# Altium footprint library PcbLib.PcbLib: 428 footprints (part 5 of 27)
Each footprint in its own frame and in the unit in brackets; x right, y up, seen from the top. Pads: shape width x height; smd on the part's side, far side on the other; paste and mask are expansions set on the pad; w line width, h text height; cw(c..) or ccw(c..) is an arc to the next point about the centre after c.
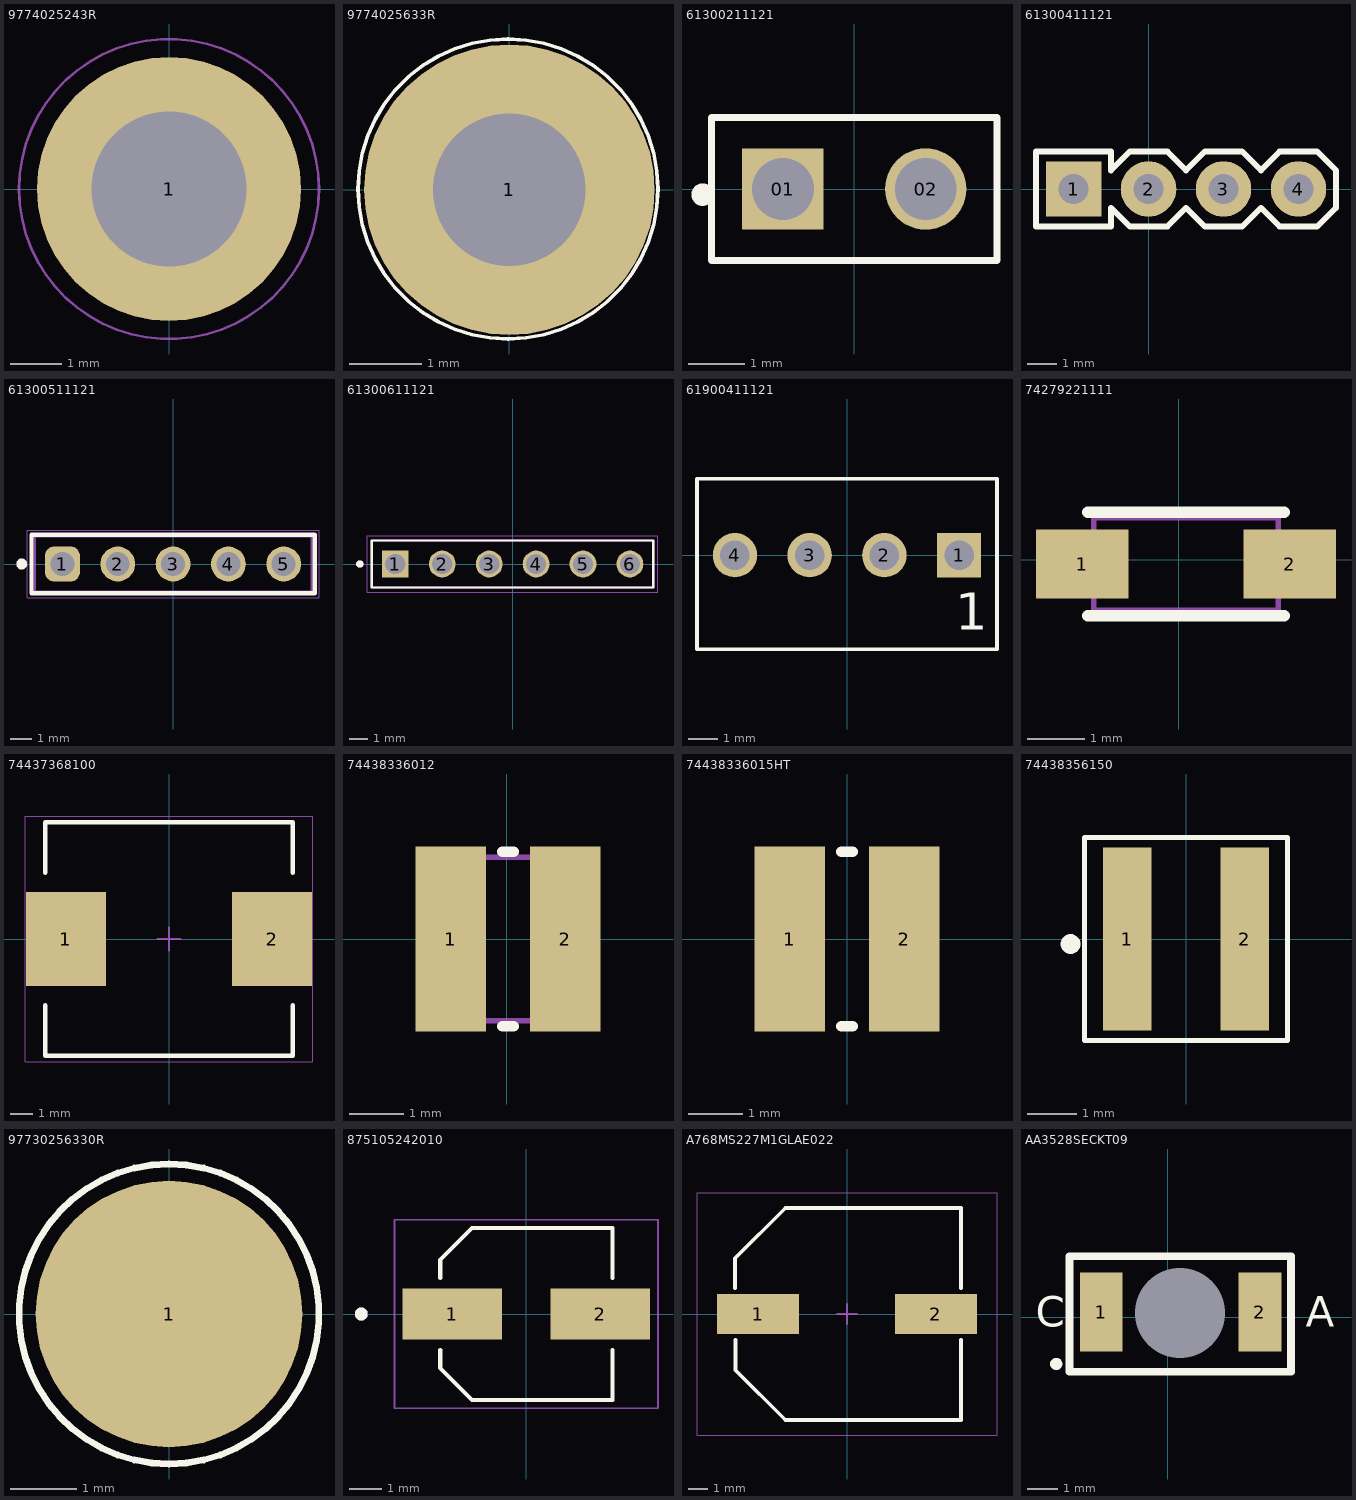
[diagram p4: the footprints below, top view; thin cyan lines are the x and y axes]

## 9774025243R [mm]
pads (2):
  round 5.1 smd paste-4: 1(0,0)
  round 3.1 hole 3 unplated: ""(0,0)
Top Paste:
  drawing of 4 lines, arcs and shapes, not listed
Mechanical 13:
  circle w0.127: c0,0 r2.175
Mechanical 15:
  circle w0.05: c0,0 r2.9
3D body "Download_STP_9774025243R_rev1.stp": height 2.6, standoff -1.3, extent -2.175,-2.163 2.175,2.163

## 9774025633R [mm]
pads (1):
  round 4 hole 2.1 mask+0.102: 1(0,0)
Top Overlay:
  circle w0.05: c-0.02,0.01 r2.065
Top Paste:
  drawing of 4 lines, arcs and shapes, not listed
3D body "Download_STEP_9774025633_rev1.stp": height 2.6, standoff -0.6, extent -1.67,-1.628 1.63,1.648

## 61300211121 [mm]
pads (2):
  rect 1.45x1.45 / inner round 1.45 / far side rect 1.45x1.45 hole 1.1: 01(-1.27,0)
  round 1.45 hole 1.1: 02(1.27,0)
Top Overlay:
  circle w0.2: c-2.7,-0.1 r0.1
  lines w0.127: -2.54,-1.27 2.54,-1.27 2.54,1.27 -2.54,1.27 -2.54,-1.27

## 61300411121 [mil]
pads (4):
  rect 74x74 / inner round 74 / far side rect 74x74 hole 40: 1(-100,0)
  round 74 hole 40: 2(0,0) 3(100,0) 4(200,0)
Top Overlay:
  lines w8: -150,-50 -50,-50 -50,-25 -25,-50 25,-50 50,-25 75,-50 125,-50 150,-25 175,-50 225,-50 250,-25 250,25 225,50 175,50 150,25 125,50 75,50 50,25 25,50 -25,50 -50,25 -50,50 -150,50 -150,-50
Mechanical 13:
  region: -90,-10 -110,-10 -110,10 -90,10
  region: 10,-10 -10,-10 -10,10 10,10
  region: 110,-10 90,-10 90,10 110,10
  region: 210,-10 190,-10 190,10 210,10

## 61300511121 [mm] "Pin Header, pitch 2.54 mm, THT, Vertical, single row, 5p"
height 8.54
pads (5):
  rrect50% 1.6x1.6 hole 1.1: 1(-5.08,0)
  round 1.6 hole 1.1: 2(-2.54,0) 3(0,0) 4(2.54,0) 5(5.08,0)
Top Overlay:
  circle w0.25: c-6.95,0 r0.125
  lines w0.2: -6.5,-1.345 -6.5,1.345 6.5,1.345 6.5,-1.345 -6.5,-1.345
Top Courtyard:
  lines w0.05: -6.7,-1.545 6.7,-1.545 6.7,1.545 -6.7,1.545 -6.7,-1.545
Top Component Outline:
  lines w0.1: -6.35,-1.27 6.35,-1.27 6.35,1.27 -6.35,1.27 -6.35,-1.27
Top Component Center:
  lines w0.05: -0.5,0 0.5,0 ; 0,-0.5 0,0.5
3D body "61300511121.stp": height 8.57, standoff -2.97, extent -6.35,-1.27 6.35,1.27

## 61300611121 [mm]
pads (6):
  rect 1.45x1.45 / inner round 1.45 / far side rect 1.45x1.45 hole 1.1: 1(-6.35,0)
  round 1.45 hole 1.1: 2(-3.81,0) 3(-1.27,0) 4(1.27,0) 5(3.81,0) 6(6.35,0)
Top Overlay:
  circle w0.2: c-8.27,0 r0.1
  lines w0.127: -7.62,-1.27 -7.62,1.27 7.62,1.27 7.62,-1.27 -7.62,-1.27
Mechanical 13:
  circle w0.2: c-8.27,0 r0.1
  lines w0.127: -7.62,-1.27 -7.62,1.27 7.62,1.27 7.62,-1.27 -7.62,-1.27
Mechanical 15:
  lines w0.05: -7.87,-1.52 -7.87,1.52 7.87,1.52 7.87,-1.52 -7.87,-1.52

## 61900411121 [mm]
pads (4):
  rect 1.508x1.508 hole 1: 1(3.81,0)
  round 1.508 hole 1: 2(1.27,0) 3(-1.27,0) 4(-3.81,0)
Top Overlay:
  lines w0.127: -5.1,-3.2 -5.1,2.6 5.1,2.6 5.1,-3.2 -5.1,-3.2
  text "1" at 3.683,-2.54 h1.27
3D body "61900411121.stp": height 11.75, standoff -3.15, extent -5.08,-3.26 5.08,2.54

## 74279221111 [mm]
pads (2):
  rect 1.6x1.2 smd: 1(-1.673,-0.076) 2(1.927,-0.076)
Top Overlay:
  lines w0.2: -1.573,-0.976 1.827,-0.976 ; -1.573,0.824 1.827,0.824
Mechanical 13:
  lines w0.1: -1.473,-0.876 -1.473,0.724 1.727,0.724 1.727,-0.876 -1.473,-0.876
3D body "WE-MPSB_1206_MPSB+%28rev1%29.stp": height 1.1, standoff 0, extent -1.498,-0.876 1.702,0.724

## 74437368100 [mm] "Precision Wire Wound Inductor, 2-Leads, Body 10.80x10.16mm, IPC Medium Density"
height 4
pads (2):
  rect 3.5x4.1 smd: 1(-4.5,0) 2(4.5,0)
Top Overlay:
  lines w0.2: -5.4,-2.9 -5.4,-5.1 5.4,-5.1 5.4,-2.9 ; -5.4,2.9 -5.4,5.1 5.4,5.1 5.4,2.9
Mechanical 15:
  lines w0.05: -6.275,-5.35 6.275,-5.35 6.275,5.35 -6.275,5.35 -6.275,-5.35
  lines w0.1: -0.5,0 0.5,0 ; 0,-0.5 0,0.5
3D body "74437368010_Download_STP_WE-LHMI-1040_rev1.stp": height 3.8, standoff 0, extent -5.5,-5 5.5,5

## 74438336012 [mm]
pads (2):
  rect 1.3x3.4 smd paste+0 mask+0.102: 1(-1.025,0) 2(1.075,0)
Top Overlay:
  lines w0.2: -0.075,-1.6 0.125,-1.6 ; -0.075,1.6 0.125,1.6
Mechanical 13:
  lines w0.1: -1.475,-1.5 1.525,-1.5 1.525,1.5 -1.475,1.5 -1.475,-1.5
3D body "WE-MAPI_3020+%28rev1%29.stp": height 2, standoff 0, extent -1.5,-1.5 1.5,1.5

## 74438336015HT [mm]
pads (2):
  rect 1.3x3.4 smd: 1(-1.05,0) 2(1.05,0)
Top Overlay:
  lines w0.2: -0.1,-1.6 0.1,-1.6 ; -0.1,1.6 0.1,1.6
3D body "step_temp.STEP": height 2.1, standoff 0.1, extent -1.5,-1.5 1.5,1.5

## 74438356150 [mm]
pads (2):
  rect 0.98x3.7 smd: 1(-1.185,0) 2(1.185,0)
Top Overlay:
  circle w0.2: c-2.335,-0.102 r0.1
  lines w0.1: -2.05,-2.05 -2.05,2.05 2.05,2.05 2.05,-2.05 -2.05,-2.05
3D body "74438356150.stp": height 2.2, standoff 0, extent -2.05,-2.025 2.05,2.075

## 97730256330R [mm]
pads (1):
  round 4 smd: 1(0,0)
Top Overlay:
  lines w0.1: 0,-2.25 ccw(c0,0) 0,2.25 ccw(c0,0) 0,-2.25
3D body "97730256330R.stp": height 2.5, standoff 0, extent -1.65,-1.636 1.65,1.64

## 875105242010 [mm]
pads (2):
  rect 3.06x1.58 smd: 1(-2.275,0) 2(2.275,0)
Top Overlay:
  circle w0.2: c-5.08,0 r0.1
  lines w0.127: -2.65,-1.11 -2.65,-1.668 -1.668,-2.65 2.65,-2.65 2.65,-1.11 ; -2.65,1.11 -2.65,1.668 -1.668,2.65 2.65,2.65 2.65,1.11
Mechanical 13:
  circle w0.2: c-5.08,0 r0.1
Mechanical 15:
  lines w0.05: -4.055,-2.9 -4.055,2.9 4.055,2.9 4.055,-2.9 -4.055,-2.9
3D body "Download_STP_875105x4200x_rev1.stp": height 5.55, standoff 0.05, extent -3,-2.65 3,2.65

## A768MS227M1GLAE022 [mm] "Aluminum Electrolytic Capacitor, Body 10.80x10.30x10.40mm, IPC Low Density"
height 10.4
pads (2):
  rect 4.15x2.05 smd: 1(-4.5,0) 2(4.5,0)
Top Overlay:
  lines w0.2: -5.664,1.325 -5.664,2.823 -3.128,5.359 5.766,5.359 5.766,1.325 ; -5.639,-1.325 -5.639,-2.849 -3.128,-5.359 5.766,-5.359 5.766,-1.325
Mechanical 15:
  lines w0.05: -7.6,-6.15 7.6,-6.15 7.6,6.15 -7.6,6.15 -7.6,-6.15
  lines w0.1: -0.5,0 0.5,0 ; 0,-0.5 0,0.5
3D body "A768MS227M1GLAE022.step": height 12.9, standoff 0.2, extent -5.537,-5.25 5.663,5.25

## AA3528SECKT09 [mil]
pads (3):
  rect 55.12x102.36 smd: 1(-86,7) 2(119,7)
  round 0 hole 116.14 unplated: 6(16,6)
Top Overlay:
  circle w7.87: c-144,-60 r3.94
  lines w10: -127,-70 -127,79 159,79 159,-70 -127,-70
  text "A" at 177.87,-12.13 h39.37
  text "C" at -170.13,-12.13 h39.37
3D body: height 3.94, standoff 0, extent -35.18,-45.18 67.18,57.18
3D body "AA3528-09.STEP": height 76.85, standoff 2.04, extent -85.72,-48.12 119,62.12